# Altium footprint library 15EDG.PcbLib: 46 footprints (part 1 of 3)
Each footprint in its own frame and in the unit in brackets; x right, y up, seen from the top. Pads: shape width x height; smd on the part's side, far side on the other; paste and mask are expansions set on the pad; w line width, h text height; cw(c..) or ccw(c..) is an arc to the next point about the centre after c.
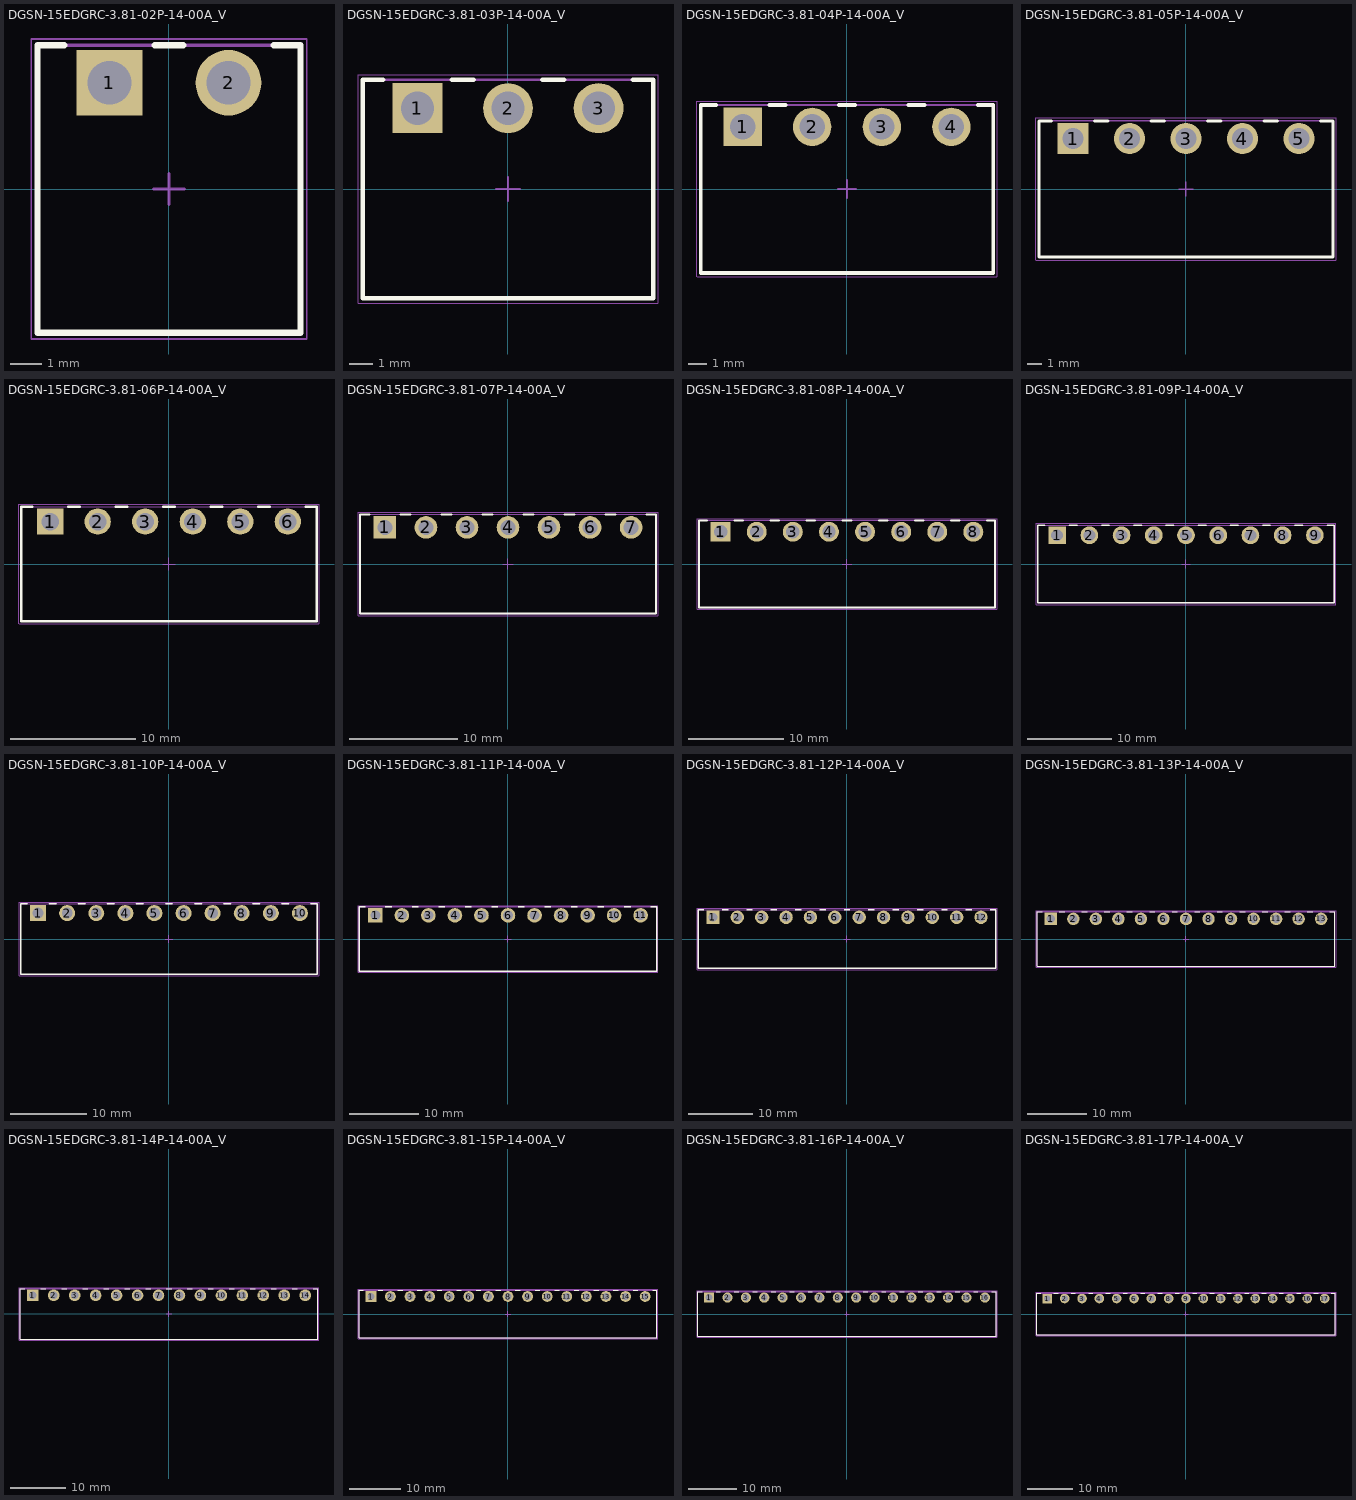
[diagram p0: the footprints below, top view; thin cyan lines are the x and y axes]

## DGSN-15EDGRC-3.81-02P-14-00A_V [mm] "Terminal Block, 2-Pin, Body 8.41x9.2mm, Pitch 3.81mm"
height 7.24
pads (2):
  rect 2.1x2.1 hole 1.4: 1(-1.905,3.4)
  round 2.1 hole 1.4: 2(1.905,3.4)
Top Overlay:
  lines w0.2: -3.355,4.6 -4.205,4.6 -4.205,-4.6 4.205,-4.6 4.205,4.6 3.355,4.6 ; -0.455,4.6 0.455,4.6
Mechanical 13:
  lines w0.1: -4.205,-4.6 4.205,-4.6 4.205,4.6 -4.205,4.6 -4.205,-4.6
Mechanical 15:
  lines w0.05: -4.405,-4.8 -4.405,4.8 ; -4.405,-4.8 4.405,-4.8 4.405,4.8 -4.405,4.8
  lines w0.1: -0.5,0 0.5,0 ; 0,-0.5 0,0.5
3D body "15EDGRC-3.81-02P-14-00AH.STEP": height 7.2, standoff -3.4, extent -4.205,-4.6 4.205,4.6

## DGSN-15EDGRC-3.81-03P-14-00A_V [mm] "Terminal Block, 3-Pin, Body 12.22x9.2mm, Pitch 3.81mm"
height 7.24
pads (3):
  rect 2.1x2.1 hole 1.4: 1(-3.81,3.4)
  round 2.1 hole 1.4: 2(0,3.4) 3(3.81,3.4)
Top Overlay:
  lines w0.2: -5.26,4.6 -6.11,4.6 -6.11,-4.6 6.11,-4.6 6.11,4.6 5.26,4.6 ; -2.36,4.6 -1.45,4.6 ; 1.45,4.6 2.36,4.6
Mechanical 13:
  lines w0.1: -6.11,-4.6 -6.11,4.6 6.11,4.6 6.11,-4.6 -6.11,-4.6
Mechanical 15:
  lines w0.05: -6.31,-4.8 -6.31,4.8 ; -6.31,-4.8 6.31,-4.8 6.31,4.8 -6.31,4.8
  lines w0.1: -0.5,0 0.5,0 ; 0,-0.5 0,0.5
3D body "15EDGRC-3.81-03P-14-00AH.STEP": height 7.2, standoff -3.4, extent -6.11,-4.6 6.11,4.6

## DGSN-15EDGRC-3.81-04P-14-00A_V [mm] "Terminal Block, 4-Pin, Body 16.03x9.2mm, Pitch 3.81mm"
height 7.24
pads (4):
  rect 2.1x2.1 hole 1.4: 1(-5.715,3.4)
  round 2.1 hole 1.4: 2(-1.905,3.4) 3(1.905,3.4) 4(5.715,3.4)
Top Overlay:
  lines w0.2: -7.165,4.6 -8.015,4.6 -8.015,-4.6 8.015,-4.6 8.015,4.6 7.165,4.6 ; -4.265,4.6 -3.355,4.6 ; -0.455,4.6 0.455,4.6 ; 3.355,4.6 4.265,4.6
Mechanical 13:
  lines w0.1: -8.015,-4.6 8.015,-4.6 8.015,4.6 -8.015,4.6 -8.015,-4.6
Mechanical 15:
  lines w0.05: -8.215,-4.8 -8.215,4.8 ; -8.215,-4.8 8.215,-4.8 8.215,4.8 -8.215,4.8
  lines w0.1: -0.5,0 0.5,0 ; 0,-0.5 0,0.5
3D body "15EDGRC-3.81-04P-14-00AH.STEP": height 7.2, standoff -3.4, extent -8.015,-4.6 8.015,4.6

## DGSN-15EDGRC-3.81-05P-14-00A_V [mm] "Terminal Block, 5-Pin, Body 19.84x9.2mm, Pitch 3.81mm"
height 7.24
pads (5):
  rect 2.1x2.1 hole 1.4: 1(-7.62,3.4)
  round 2.1 hole 1.4: 2(-3.81,3.4) 3(0,3.4) 4(3.81,3.4) 5(7.62,3.4)
Top Overlay:
  lines w0.2: -9.07,4.6 -9.92,4.6 -9.92,-4.6 9.92,-4.6 9.92,4.6 9.07,4.6 ; -6.17,4.6 -5.26,4.6 ; -2.36,4.6 -1.45,4.6 ; 1.45,4.6 2.36,4.6 ; 5.26,4.6 6.17,4.6
Mechanical 13:
  lines w0.1: -9.92,-4.6 9.92,-4.6 9.92,4.6 -9.92,4.6 -9.92,-4.6
Mechanical 15:
  lines w0.05: -10.12,-4.8 -10.12,4.8 ; -10.12,-4.8 10.12,-4.8 10.12,4.8 -10.12,4.8
  lines w0.1: -0.5,0 0.5,0 ; 0,-0.5 0,0.5
3D body "15EDGRC-3.81-05P-14-00AH.STEP": height 7.2, standoff -3.4, extent -9.92,-4.6 9.92,4.6

## DGSN-15EDGRC-3.81-06P-14-00A_V [mm] "Terminal Block, 6-Pin, Body 23.65x9.2mm, Pitch 3.81mm"
height 7.24
pads (6):
  rect 2.1x2.1 hole 1.4: 1(-9.525,3.4)
  round 2.1 hole 1.4: 2(-5.715,3.4) 3(-1.905,3.4) 4(1.905,3.4) 5(5.715,3.4) 6(9.525,3.4)
Top Overlay:
  lines w0.2: -10.975,4.6 -11.825,4.6 -11.825,-4.6 11.825,-4.6 11.825,4.6 10.975,4.6 ; -8.075,4.6 -7.165,4.6 ; -4.265,4.6 -3.355,4.6 ; -0.455,4.6 0.455,4.6 ; 3.355,4.6 4.265,4.6 ; 7.165,4.6 8.075,4.6
Mechanical 13:
  lines w0.1: -11.825,-4.6 11.825,-4.6 11.825,4.6 -11.825,4.6 -11.825,-4.6
Mechanical 15:
  lines w0.05: -12.025,-4.8 -12.025,4.8 ; -12.025,-4.8 12.025,-4.8 12.025,4.8 -12.025,4.8
  lines w0.1: -0.5,0 0.5,0 ; 0,-0.5 0,0.5
3D body "15EDGRC-3.81-06P-14-00AH.STEP": height 7.2, standoff -3.4, extent -11.825,-4.6 11.825,4.6

## DGSN-15EDGRC-3.81-07P-14-00A_V [mm] "Terminal Block, 7-Pin, Body 27.46x9.2mm, Pitch 3.81mm"
height 7.24
pads (7):
  rect 2.1x2.1 hole 1.4: 1(-11.43,3.4)
  round 2.1 hole 1.4: 2(-7.62,3.4) 3(-3.81,3.4) 4(0,3.4) 5(3.81,3.4) 6(7.62,3.4) 7(11.43,3.4)
Top Overlay:
  lines w0.2: -12.88,4.6 -13.73,4.6 -13.73,-4.6 13.73,-4.6 13.73,4.6 12.88,4.6 ; -9.98,4.6 -9.07,4.6 ; -6.17,4.6 -5.26,4.6 ; -2.36,4.6 -1.45,4.6 ; 1.45,4.6 2.36,4.6 ; 5.26,4.6 6.17,4.6 ; 9.07,4.6 9.98,4.6
Mechanical 13:
  lines w0.1: -13.73,-4.6 -13.73,4.6 13.73,4.6 13.73,-4.6 -13.73,-4.6
Mechanical 15:
  lines w0.05: -13.93,-4.8 -13.93,4.8 ; -13.93,-4.8 13.93,-4.8 13.93,4.8 -13.93,4.8
  lines w0.1: -0.5,0 0.5,0 ; 0,-0.5 0,0.5
3D body "15EDGRC-3.81-07P-14-00AH.STEP": height 7.2, standoff -3.4, extent -13.73,-4.6 13.73,4.6

## DGSN-15EDGRC-3.81-08P-14-00A_V [mm] "Terminal Block, 8-Pin, Body 31.27x9.2mm, Pitch 3.81mm"
height 7.24
pads (8):
  rect 2.1x2.1 hole 1.4: 1(-13.335,3.4)
  round 2.1 hole 1.4: 2(-9.525,3.4) 3(-5.715,3.4) 4(-1.905,3.4) 5(1.905,3.4) 6(5.715,3.4) 7(9.525,3.4) 8(13.335,3.4)
Top Overlay:
  lines w0.2: -14.785,4.6 -15.635,4.6 -15.635,-4.6 15.635,-4.6 15.635,4.6 14.785,4.6 ; -11.885,4.6 -10.975,4.6 ; -8.075,4.6 -7.165,4.6 ; -4.265,4.6 -3.355,4.6 ; -0.455,4.6 0.455,4.6 ; 3.355,4.6 4.265,4.6 ; 7.165,4.6 8.075,4.6 ; 10.975,4.6 11.885,4.6
Mechanical 13:
  lines w0.1: -15.635,-4.6 15.635,-4.6 15.635,4.6 -15.635,4.6 -15.635,-4.6
Mechanical 15:
  lines w0.05: -15.835,-4.8 -15.835,4.8 ; -15.835,-4.8 15.835,-4.8 15.835,4.8 -15.835,4.8
  lines w0.1: -0.5,0 0.5,0 ; 0,-0.5 0,0.5
3D body "15EDGRC-3.81-08P-14-00AH.STEP": height 7.2, standoff -3.4, extent -15.635,-4.6 15.635,4.6

## DGSN-15EDGRC-3.81-09P-14-00A_V [mm] "Terminal Block, 9-Pin, Body 35.08x9.2mm, Pitch 3.81mm"
height 7.24
pads (9):
  rect 2.1x2.1 hole 1.4: 1(-15.24,3.4)
  round 2.1 hole 1.4: 2(-11.43,3.4) 3(-7.62,3.4) 4(-3.81,3.4) 5(0,3.4) 6(3.81,3.4) 7(7.62,3.4) 8(11.43,3.4) 9(15.24,3.4)
Top Overlay:
  lines w0.2: -16.69,4.6 -17.54,4.6 -17.54,-4.6 17.54,-4.6 17.54,4.6 16.69,4.6 ; -13.79,4.6 -12.88,4.6 ; -9.98,4.6 -9.07,4.6 ; -6.17,4.6 -5.26,4.6 ; -2.36,4.6 -1.45,4.6 ; 1.45,4.6 2.36,4.6 ; 5.26,4.6 6.17,4.6 ; 9.07,4.6 9.98,4.6 ; 12.88,4.6 13.79,4.6
Mechanical 13:
  lines w0.1: -17.54,-4.6 17.54,-4.6 17.54,4.6 -17.54,4.6 -17.54,-4.6
Mechanical 15:
  lines w0.05: -17.74,-4.8 -17.74,4.8 ; -17.74,-4.8 17.74,-4.8 17.74,4.8 -17.74,4.8
  lines w0.1: -0.5,0 0.5,0 ; 0,-0.5 0,0.5
3D body "15EDGRC-3.81-09P-14-00AH.STEP": height 7.2, standoff -3.4, extent -17.54,-4.6 17.54,4.6

## DGSN-15EDGRC-3.81-10P-14-00A_V [mm] "Terminal Block, 10-Pin, Body 38.89x9.2mm, Pitch 3.81mm"
height 7.24
pads (10):
  rect 2.1x2.1 hole 1.4: 1(-17.145,3.4)
  round 2.1 hole 1.4: 2(-13.335,3.4) 3(-9.525,3.4) 4(-5.715,3.4) 5(-1.905,3.4) 6(1.905,3.4) 7(5.715,3.4) 8(9.525,3.4) 9(13.335,3.4) 10(17.145,3.4)
Top Overlay:
  lines w0.2: -18.595,4.6 -19.445,4.6 -19.445,-4.6 19.445,-4.6 19.445,4.6 18.595,4.6 ; -15.695,4.6 -14.785,4.6 ; -11.885,4.6 -10.975,4.6 ; -8.075,4.6 -7.165,4.6 ; -4.265,4.6 -3.355,4.6 ; -0.455,4.6 0.455,4.6 ; 3.355,4.6 4.265,4.6 ; 7.165,4.6 8.075,4.6 ; 10.975,4.6 11.885,4.6 ; 14.785,4.6 15.695,4.6
Mechanical 13:
  lines w0.1: -19.445,-4.6 19.445,-4.6 19.445,4.6 -19.445,4.6 -19.445,-4.6
Mechanical 15:
  lines w0.05: -19.645,-4.8 -19.645,4.8 ; -19.645,-4.8 19.645,-4.8 19.645,4.8 -19.645,4.8
  lines w0.1: -0.5,0 0.5,0 ; 0,-0.5 0,0.5
3D body "15EDGRC-3.81-10P-14-00AH.STEP": height 7.2, standoff -3.4, extent -19.445,-4.6 19.445,4.6

## DGSN-15EDGRC-3.81-11P-14-00A_V [mm] "Terminal Block, 11-Pin, Body 42.70x9.2mm, Pitch 3.81mm"
height 7.24
pads (11):
  rect 2.1x2.1 hole 1.4: 1(-19.05,3.4)
  round 2.1 hole 1.4: 2(-15.24,3.4) 3(-11.43,3.4) 4(-7.62,3.4) 5(-3.81,3.4) 6(0,3.4) 7(3.81,3.4) 8(7.62,3.4) 9(11.43,3.4) 10(15.24,3.4) 11(19.05,3.4)
Top Overlay:
  lines w0.2: -20.5,4.6 -21.35,4.6 -21.35,-4.6 21.35,-4.6 21.35,4.6 20.5,4.6 ; -17.6,4.6 -16.69,4.6 ; -13.79,4.6 -12.88,4.6 ; -9.98,4.6 -9.07,4.6 ; -6.17,4.6 -5.26,4.6 ; -2.36,4.6 -1.45,4.6 ; 1.45,4.6 2.36,4.6 ; 5.26,4.6 6.17,4.6 ; 9.07,4.6 9.98,4.6 ; 12.88,4.6 13.79,4.6 ; 16.69,4.6 17.6,4.6
Mechanical 13:
  lines w0.1: -21.35,-4.6 21.35,-4.6 21.35,4.6 -21.35,4.6 -21.35,-4.6
Mechanical 15:
  lines w0.05: -21.55,-4.8 -21.55,4.8 ; -21.55,-4.8 21.55,-4.8 21.55,4.8 -21.55,4.8
  lines w0.1: -0.5,0 0.5,0 ; 0,-0.5 0,0.5
3D body "15EDGRC-3.81-11P-14-00AH.STEP": height 7.2, standoff -3.4, extent -21.35,-4.6 21.35,4.6

## DGSN-15EDGRC-3.81-12P-14-00A_V [mm] "Terminal Block, 12-Pin, Body 46.51x9.2mm, Pitch 3.81mm"
height 7.24
pads (12):
  rect 2.1x2.1 hole 1.4: 1(-20.955,3.4)
  round 2.1 hole 1.4: 2(-17.145,3.4) 3(-13.335,3.4) 4(-9.525,3.4) 5(-5.715,3.4) 6(-1.905,3.4) 7(1.905,3.4) 8(5.715,3.4) 9(9.525,3.4) 10(13.335,3.4) 11(17.145,3.4) 12(20.955,3.4)
Top Overlay:
  lines w0.2: -22.405,4.6 -23.255,4.6 -23.255,-4.6 23.255,-4.6 23.255,4.6 22.405,4.6 ; -19.505,4.6 -18.595,4.6 ; -15.695,4.6 -14.785,4.6 ; -11.885,4.6 -10.975,4.6 ; -8.075,4.6 -7.165,4.6 ; -4.265,4.6 -3.355,4.6 ; -0.455,4.6 0.455,4.6 ; 3.355,4.6 4.265,4.6 ; 7.165,4.6 8.075,4.6 ; 10.975,4.6 11.885,4.6 ; 14.785,4.6 15.695,4.6 ; 18.595,4.6 19.505,4.6
Mechanical 13:
  lines w0.1: -23.255,-4.6 23.255,-4.6 23.255,4.6 -23.255,4.6 -23.255,-4.6
Mechanical 15:
  lines w0.05: -23.455,-4.8 -23.455,4.8 ; -23.455,-4.8 23.455,-4.8 23.455,4.8 -23.455,4.8
  lines w0.1: -0.5,0 0.5,0 ; 0,-0.5 0,0.5
3D body "15EDGRC-3.81-12P-14-00AH.STEP": height 7.2, standoff -3.4, extent -23.255,-4.6 23.255,4.6

## DGSN-15EDGRC-3.81-13P-14-00A_V [mm] "Terminal Block, 13-Pin, Body 50.32x9.2mm, Pitch 3.81mm"
height 7.24
pads (13):
  rect 2.1x2.1 hole 1.4: 1(-22.86,3.4)
  round 2.1 hole 1.4: 2(-19.05,3.4) 3(-15.24,3.4) 4(-11.43,3.4) 5(-7.62,3.4) 6(-3.81,3.4) 7(0,3.4) 8(3.81,3.4) 9(7.62,3.4) 10(11.43,3.4) 11(15.24,3.4) 12(19.05,3.4) 13(22.86,3.4)
Top Overlay:
  lines w0.2: -24.31,4.6 -25.16,4.6 -25.16,-4.6 25.16,-4.6 25.16,4.6 24.31,4.6 ; -21.41,4.6 -20.5,4.6 ; -17.6,4.6 -16.69,4.6 ; -13.79,4.6 -12.88,4.6 ; -9.98,4.6 -9.07,4.6 ; -6.17,4.6 -5.26,4.6 ; -2.36,4.6 -1.45,4.6 ; 1.45,4.6 2.36,4.6 ; 5.26,4.6 6.17,4.6 ; 9.07,4.6 9.98,4.6 ; 12.88,4.6 13.79,4.6 ; 16.69,4.6 17.6,4.6 ; 20.5,4.6 21.41,4.6
Mechanical 13:
  lines w0.1: -25.16,-4.6 25.16,-4.6 25.16,4.6 -25.16,4.6 -25.16,-4.6
Mechanical 15:
  lines w0.05: -25.36,-4.8 -25.36,4.8 ; -25.36,-4.8 25.36,-4.8 25.36,4.8 -25.36,4.8
  lines w0.1: -0.5,0 0.5,0 ; 0,-0.5 0,0.5
3D body "15EDGRC-3.81-13P-14-00AH.STEP": height 7.2, standoff -3.4, extent -25.16,-4.6 25.16,4.6

## DGSN-15EDGRC-3.81-14P-14-00A_V [mm] "Terminal Block, 14-Pin, Body 54.13x9.2mm, Pitch 3.81mm"
height 7.24
pads (14):
  rect 2.1x2.1 hole 1.4: 1(-24.765,3.4)
  round 2.1 hole 1.4: 2(-20.955,3.4) 3(-17.145,3.4) 4(-13.335,3.4) 5(-9.525,3.4) 6(-5.715,3.4) 7(-1.905,3.4) 8(1.905,3.4) 9(5.715,3.4) 10(9.525,3.4) 11(13.335,3.4) 12(17.145,3.4) 13(20.955,3.4) 14(24.765,3.4)
Top Overlay:
  lines w0.2: -26.215,4.6 -27.065,4.6 -27.065,-4.6 27.065,-4.6 27.065,4.6 26.215,4.6 ; -23.315,4.6 -22.405,4.6 ; -19.505,4.6 -18.595,4.6 ; -15.695,4.6 -14.785,4.6 ; -11.885,4.6 -10.975,4.6 ; -8.075,4.6 -7.165,4.6 ; -4.265,4.6 -3.355,4.6 ; -0.455,4.6 0.455,4.6 ; 3.355,4.6 4.265,4.6 ; 7.165,4.6 8.075,4.6 ; 10.975,4.6 11.885,4.6 ; 14.785,4.6 15.695,4.6 ; 18.595,4.6 19.505,4.6 ; 22.405,4.6 23.315,4.6
Mechanical 13:
  lines w0.1: -27.065,-4.6 27.065,-4.6 27.065,4.6 -27.065,4.6 -27.065,-4.6
Mechanical 15:
  lines w0.05: -27.265,-4.8 -27.265,4.8 ; -27.265,-4.8 27.265,-4.8 27.265,4.8 -27.265,4.8
  lines w0.1: -0.5,0 0.5,0 ; 0,-0.5 0,0.5
3D body "15EDGRC-3.81-14P-14-00AH.STEP": height 7.2, standoff -3.4, extent -27.065,-4.6 27.065,4.6

## DGSN-15EDGRC-3.81-15P-14-00A_V [mm] "Terminal Block, 15-Pin, Body 57.94x9.2mm, Pitch 3.81mm"
height 7.24
pads (15):
  rect 2.1x2.1 hole 1.4: 1(-26.67,3.4)
  round 2.1 hole 1.4: 2(-22.86,3.4) 3(-19.05,3.4) 4(-15.24,3.4) 5(-11.43,3.4) 6(-7.62,3.4) 7(-3.81,3.4) 8(0,3.4) 9(3.81,3.4) 10(7.62,3.4) 11(11.43,3.4) 12(15.24,3.4) 13(19.05,3.4) 14(22.86,3.4) 15(26.67,3.4)
Top Overlay:
  lines w0.2: -28.12,4.6 -28.97,4.6 -28.97,-4.6 28.97,-4.6 28.97,4.6 28.12,4.6 ; -25.22,4.6 -24.31,4.6 ; -21.41,4.6 -20.5,4.6 ; -17.6,4.6 -16.69,4.6 ; -13.79,4.6 -12.88,4.6 ; -9.98,4.6 -9.07,4.6 ; -6.17,4.6 -5.26,4.6 ; -2.36,4.6 -1.45,4.6 ; 1.45,4.6 2.36,4.6 ; 5.26,4.6 6.17,4.6 ; 9.07,4.6 9.98,4.6 ; 12.88,4.6 13.79,4.6 ; 16.69,4.6 17.6,4.6 ; 20.5,4.6 21.41,4.6 ; 24.31,4.6 25.22,4.6
Mechanical 13:
  lines w0.1: -28.97,-4.6 28.97,-4.6 28.97,4.6 -28.97,4.6 -28.97,-4.6
Mechanical 15:
  lines w0.05: -29.17,-4.8 -29.17,4.8 ; -29.17,-4.8 29.17,-4.8 29.17,4.8 -29.17,4.8
  lines w0.1: -0.5,0 0.5,0 ; 0,-0.5 0,0.5
3D body "15EDGRC-3.81-15P-14-00AH.STEP": height 7.2, standoff -3.4, extent -28.97,-4.6 28.97,4.6

## DGSN-15EDGRC-3.81-16P-14-00A_V [mm] "Terminal Block, 16-Pin, Body 61.75x9.2mm, Pitch 3.81mm"
height 7.24
pads (16):
  rect 2.1x2.1 hole 1.4: 1(-28.575,3.4)
  round 2.1 hole 1.4: 2(-24.765,3.4) 3(-20.955,3.4) 4(-17.145,3.4) 5(-13.335,3.4) 6(-9.525,3.4) 7(-5.715,3.4) 8(-1.905,3.4) 9(1.905,3.4) 10(5.715,3.4) 11(9.525,3.4) 12(13.335,3.4) 13(17.145,3.4) 14(20.955,3.4) 15(24.765,3.4) 16(28.575,3.4)
Top Overlay:
  lines w0.2: -30.025,4.6 -30.875,4.6 -30.875,-4.6 30.875,-4.6 30.875,4.6 30.025,4.6 ; -27.125,4.6 -26.215,4.6 ; -23.315,4.6 -22.405,4.6 ; -19.505,4.6 -18.595,4.6 ; -15.695,4.6 -14.785,4.6 ; -11.885,4.6 -10.975,4.6 ; -8.075,4.6 -7.165,4.6 ; -4.265,4.6 -3.355,4.6 ; -0.455,4.6 0.455,4.6 ; 3.355,4.6 4.265,4.6 ; 7.165,4.6 8.075,4.6 ; 10.975,4.6 11.885,4.6 ; 14.785,4.6 15.695,4.6 ; 18.595,4.6 19.505,4.6 ; 22.405,4.6 23.315,4.6 ; 26.215,4.6 27.125,4.6
Mechanical 13:
  lines w0.1: -30.875,-4.6 30.875,-4.6 30.875,4.6 -30.875,4.6 -30.875,-4.6
Mechanical 15:
  lines w0.05: -31.075,-4.8 -31.075,4.8 ; -31.075,-4.8 31.075,-4.8 31.075,4.8 -31.075,4.8
  lines w0.1: -0.5,0 0.5,0 ; 0,-0.5 0,0.5
3D body "15EDGRC-3.81-16P-14-00AH.STEP": height 7.2, standoff -3.4, extent -30.875,-4.6 30.875,4.6

## DGSN-15EDGRC-3.81-17P-14-00A_V [mm] "Terminal Block, 17-Pin, Body 65.56x9.2mm, Pitch 3.81mm"
height 7.24
pads (17):
  rect 2.1x2.1 hole 1.4: 1(-30.48,3.4)
  round 2.1 hole 1.4: 2(-26.67,3.4) 3(-22.86,3.4) 4(-19.05,3.4) 5(-15.24,3.4) 6(-11.43,3.4) 7(-7.62,3.4) 8(-3.81,3.4) 9(0,3.4) 10(3.81,3.4) 11(7.62,3.4) 12(11.43,3.4) 13(15.24,3.4) 14(19.05,3.4) 15(22.86,3.4) 16(26.67,3.4) 17(30.48,3.4)
Top Overlay:
  lines w0.2: -31.93,4.6 -32.78,4.6 -32.78,-4.6 32.78,-4.6 32.78,4.6 31.93,4.6 ; -29.03,4.6 -28.12,4.6 ; -25.22,4.6 -24.31,4.6 ; -21.41,4.6 -20.5,4.6 ; -17.6,4.6 -16.69,4.6 ; -13.79,4.6 -12.88,4.6 ; -9.98,4.6 -9.07,4.6 ; -6.17,4.6 -5.26,4.6 ; -2.36,4.6 -1.45,4.6 ; 1.45,4.6 2.36,4.6 ; 5.26,4.6 6.17,4.6 ; 9.07,4.6 9.98,4.6 ; 12.88,4.6 13.79,4.6 ; 16.69,4.6 17.6,4.6 ; 20.5,4.6 21.41,4.6 ; 24.31,4.6 25.22,4.6 ; 28.12,4.6 29.03,4.6
Mechanical 13:
  lines w0.1: -32.78,-4.6 32.78,-4.6 32.78,4.6 -32.78,4.6 -32.78,-4.6
Mechanical 15:
  lines w0.05: -32.98,-4.8 -32.98,4.8 ; -32.98,-4.8 32.98,-4.8 32.98,4.8 -32.98,4.8
  lines w0.1: -0.5,0 0.5,0 ; 0,-0.5 0,0.5
3D body "15EDGRC-3.81-17P-14-00AH.STEP": height 7.2, standoff -3.4, extent -32.78,-4.6 32.78,4.6